# Altium footprint library LUCHADOR PCBLIB.PcbLib: 75 footprints (part 2 of 5)
Each footprint in its own frame and in the unit in brackets; x right, y up, seen from the top. Pads: shape width x height; smd on the part's side, far side on the other; paste and mask are expansions set on the pad; w line width, h text height; cw(c..) or ccw(c..) is an arc to the next point about the centre after c.
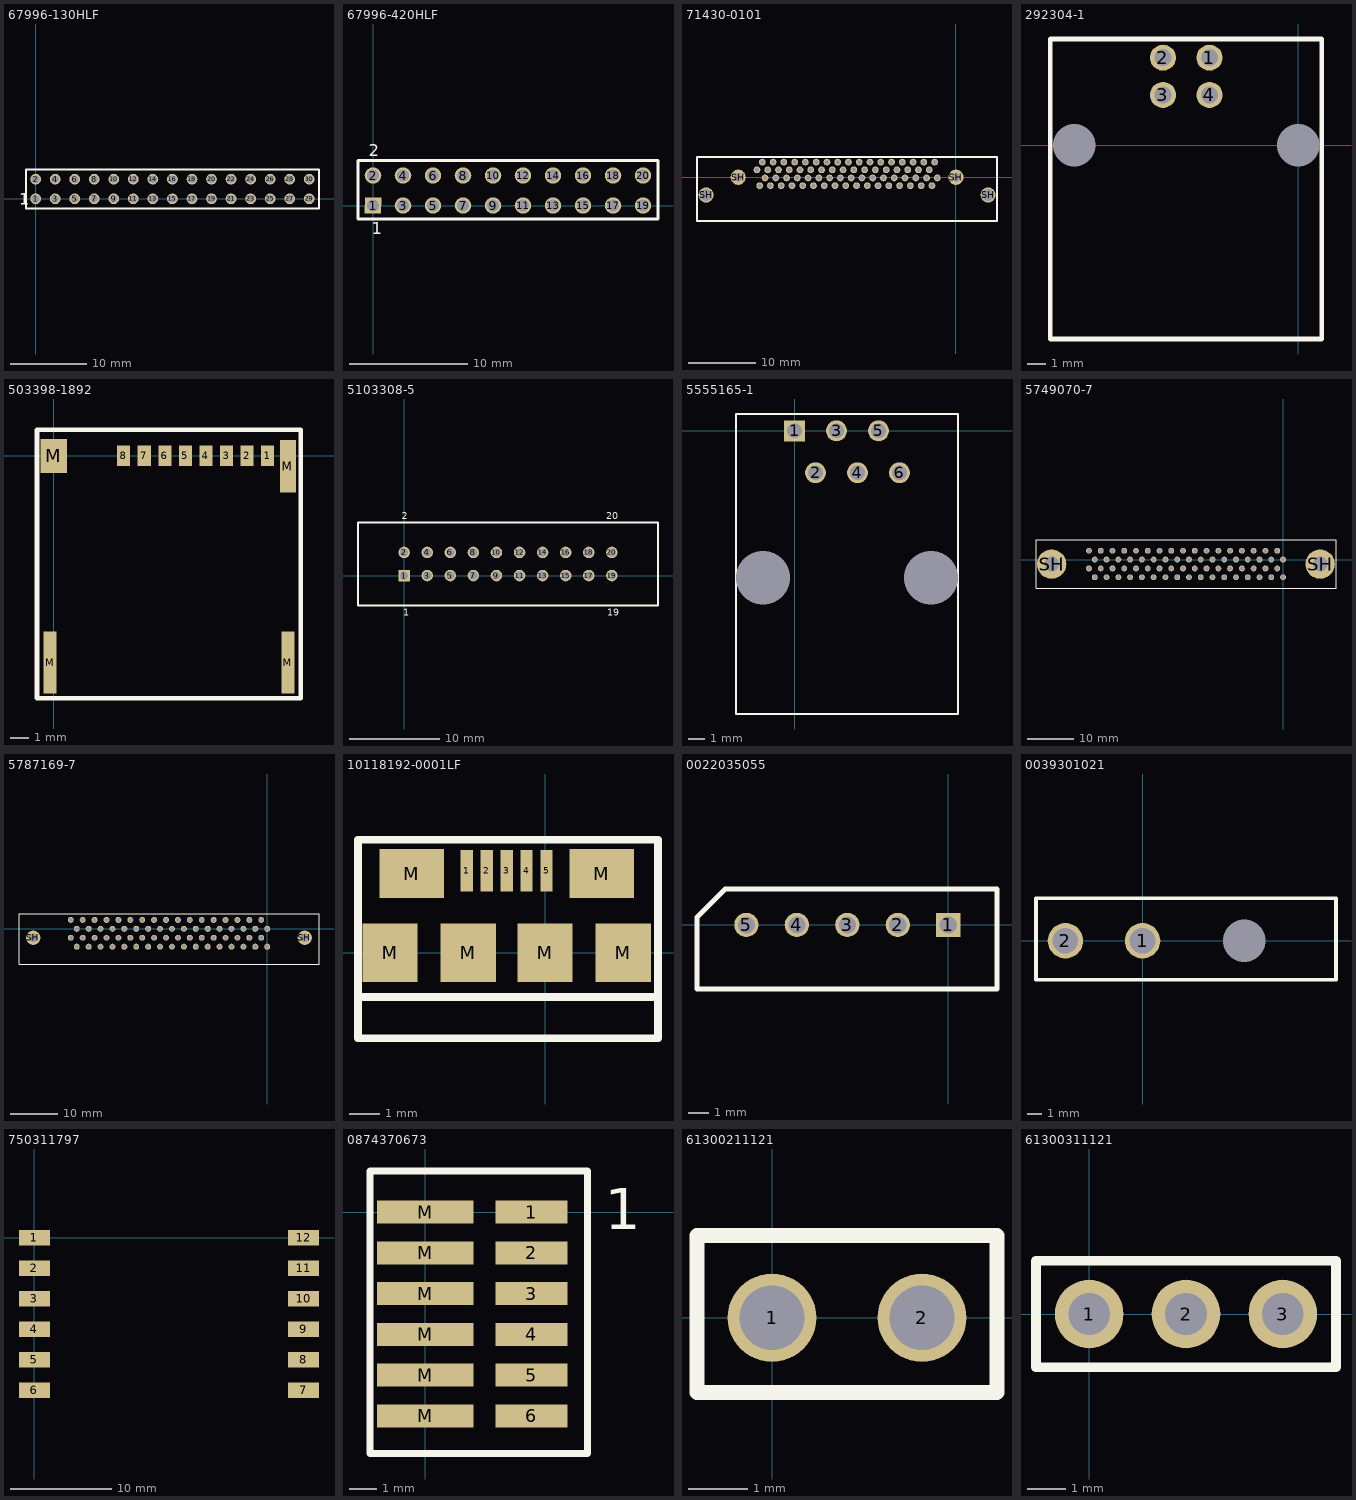
[diagram p1: the footprints below, top view; thin cyan lines are the x and y axes]

## 67996-130HLF [mil]
pads (30):
  round 55 hole 40: 1(0,0) 2(0,100) 3(100,0) 4(100,100) 5(200,0) 6(200,100) 7(300,0) 8(300,100) 9(400,0) 10(400,100) 11(500,0) 12(500,100) 13(600,0) 14(600,100) 15(700,0) 16(700,100) 17(800,0) 18(800,100) 19(900,0) 20(900,100) 21(1000,0) 22(1000,100) 23(1100,0) 24(1100,100) 25(1200,0) 26(1200,100) 27(1300,0) 28(1300,100) 29(1400,0) 30(1400,100)
Top Overlay:
  lines w10: -50,-50 1450,-50 1450,150 -50,150 -50,-50
  text "1" at -85,-30 h60
3D body "67996-130HLF.stp": height 350.5, standoff -199.5, extent -50,-49.99 1450,150.01

## 67996-420HLF [mil]
pads (20):
  rect 55x55 hole 40: 1(0,0)
  round 55 hole 40: 2(0,100) 3(100,0) 4(100,100) 5(200,0) 6(200,100) 7(300,0) 8(300,100) 9(400,0) 10(400,100) 11(500,0) 12(500,100) 13(600,0) 14(600,100) 15(700,0) 16(700,100) 17(800,0) 18(800,100) 19(900,0) 20(900,100)
Top Overlay:
  lines w10: -50,-45 -50,150 950,150 950,-45 -50,-45
  text "2" at -15,165 h40
  text "1" at -5,-95 h40
3D body "67996-420HLF.STEP": height 330.68, standoff -94.52, extent -50,-44 950,146

## 71430-0101 [mm]
pads (72):
  round 1 hole 0.65: 1(-3.17,2.25) 2(-3.97,1.1) 3(-4.77,2.25) 4(-5.57,1.1) 5(-6.37,2.25) 6(-7.17,1.1) 7(-7.97,2.25) 8(-8.77,1.1) 9(-9.57,2.25) 10(-10.37,1.1) 11(-11.17,2.25) 12(-11.97,1.1) 13(-12.77,2.25) 14(-13.57,1.1) 15(-14.37,2.25) 16(-15.17,1.1) 17(-15.97,2.25) 18(-16.77,1.1) 19(-17.57,2.25) 20(-18.37,1.1) 21(-19.17,2.25) 22(-19.97,1.1) 23(-20.77,2.25) 24(-21.57,1.1) 25(-22.37,2.25) 26(-23.17,1.1) 27(-23.97,2.25) 28(-24.77,1.1) 29(-25.57,2.25) 30(-26.37,1.1) 31(-27.17,2.25) 32(-27.97,1.1) 33(-28.77,2.25) 34(-29.57,1.1) 35(-2.77,-0.1) 36(-3.57,-1.25) 37(-4.37,-0.1) 38(-5.17,-1.25) 39(-5.97,-0.1) 40(-6.77,-1.25) 41(-7.57,-0.1) 42(-8.37,-1.25) 43(-9.17,-0.1) 44(-9.97,-1.25) 45(-10.77,-0.1) 46(-11.57,-1.25) 47(-12.37,-0.1) 48(-13.17,-1.25) 49(-13.97,-0.1) 50(-14.77,-1.25) 51(-15.57,-0.1) 52(-16.37,-1.25) 53(-17.17,-0.1) 54(-17.97,-1.25) 55(-18.77,-0.1) 56(-19.57,-1.25) 57(-20.37,-0.1) 58(-21.17,-1.25) 59(-21.97,-0.1) 60(-22.77,-1.25) 61(-23.57,-0.1) 62(-24.37,-1.25) 63(-25.17,-0.1) 64(-25.97,-1.25) 65(-26.77,-0.1) 66(-27.57,-1.25) 67(-28.37,-0.1) 68(-29.17,-1.25)
  round 2.25 hole 1.75: SH(-37.12,-2.63) SH(4.78,-2.63)
  round 2.25 hole 1.2: SH(-32.35,0) SH(0,0)
Top Overlay:
  lines w0.254: -38.476,-6.502 -38.476,3.012 6.101,3.012 6.101,-6.502 -38.476,-6.502
3D body "714300101.stp": height 6.29, standoff -2.47, extent -37.519,-11.953 5.181,2.697

## 292304-1 [mm]
pads (6):
  round 1.4 hole 0.92: 1(-4.77,4.71) 2(-7.27,4.71) 3(-7.27,2.71) 4(-4.77,2.71)
  round 0 hole 2.3 unplated: M(-12.04,0) M(0,0)
Top Overlay:
  lines w0.254: -13.335,-10.414 -13.335,5.715 1.27,5.715 1.27,-10.414 -13.335,-10.414
3D body "c-292304-1-a-3d.stp": height 11.5, standoff -3.91, extent -13.234,-10.355 1.154,5.345

## 503398-1892 [mm]
pads (12):
  rect 0.7x1.1 smd: 1(11.44,0) 2(10.34,0) 3(9.24,0) 4(8.14,0) 5(7.04,0) 6(5.94,0) 7(4.84,0) 8(3.74,0)
  rect 0.7x3.33 smd: M(-0.193,-11.049) M(12.52,-11.049)
  rect 1.42x1.83 smd: M(0,0)
  rect 0.86x2.8 smd: M(12.52,-0.559)
Top Overlay:
  lines w0.254: -0.889,-12.954 -0.889,1.397 13.208,1.397 13.208,-12.954 -0.762,-12.954 -0.889,-12.954
3D body "5033981892.stp": height 1.29, standoff 0.01, extent -0.39,-12.638 12.71,1.412

## 5103308-5 [mil]
height 39.37
pads (20):
  rect 50x50 hole 35: 1(0,0)
  round 50 hole 35: 2(0,100) 3(100,0) 4(100,100) 5(200,0) 6(200,100) 7(300,0) 8(300,100) 9(400,0) 10(400,100) 11(500,0) 12(500,100) 13(600,0) 14(600,100) 15(700,0) 16(700,100) 17(800,0) 18(800,100) 19(900,0) 20(900,100)
Top Overlay:
  lines w10: -200,-130 -200,230 1100,230 1100,-130 -200,-130
  text "20" at 875,245 h30
  text "19" at 880,-175 h30
  text "2" at -10,245 h30
  text "1" at -5,-175 h30
3D body "c-5103308-5-b-3d.stp": height 388.48, standoff -119.52, extent -200,-130 1100,230

## 5555165-1 [mil]
height 33.46
pads (8):
  rect 50x50 hole 35: 1(0,0)
  round 50 hole 35: 2(50,-100) 3(100,0) 4(150,-100) 5(200,0) 6(250,-100)
  rect 0x0 hole 128 unplated: M(-75,-350) M(325,-350)
Top Overlay:
  lines w5: -140,-675 -140,40 390,40 390,-675 -140,-675
3D body "c-5555165-1-e-3d.stp": height 495.48, standoff -149.52, extent -136,-673 387,37

## 5749070-7 [mil]
pads (70):
  round 50 hole 35: 1(0,0) 2(-50,75) 3(-100,0) 4(-150,75) 5(-200,0) 6(-250,75) 7(-300,0) 8(-350,75) 9(-400,0) 10(-450,75) 11(-500,0) 12(-550,75) 13(-600,0) 14(-650,75) 15(-700,0) 16(-750,75) 17(-800,0) 18(-850,75) 19(-900,0) 20(-950,75) 21(-1000,0) 22(-1050,75) 23(-1100,0) 24(-1150,75) 25(-1200,0) 26(-1250,75) 27(-1300,0) 28(-1350,75) 29(-1400,0) 30(-1450,75) 31(-1500,0) 32(-1550,75) 33(-1600,0) 34(-1650,75) 35(0,-150) 36(-50,-75) 37(-100,-150) 38(-150,-75) 39(-200,-150) 40(-250,-75) 41(-300,-150) 42(-350,-75) 43(-400,-150) 44(-450,-75) 45(-500,-150) 46(-550,-75) 47(-600,-150) 48(-650,-75) 49(-700,-150) 50(-750,-75) 51(-800,-150) 52(-850,-75) 53(-900,-150) 54(-950,-75) 55(-1000,-150) 56(-1050,-75) 57(-1100,-150) 58(-1150,-75) 59(-1200,-150) 60(-1250,-75) 61(-1300,-150) 62(-1350,-75) 63(-1400,-150) 64(-1450,-75) 65(-1500,-150) 66(-1550,-75) 67(-1600,-150) 68(-1650,-75)
  round 250 hole 125: SH(-1967,-38) SH(315,-38)
Top Overlay:
  lines w10: -2100,-245 -2100,170 450,170 450,-245 -2100,-245
3D body "c-5749070-07-o-3d.stp": height 347.5, standoff -124.5, extent -2083,-240 432,166

## 5787169-7 [mil]
pads (70):
  round 50 hole 34: 1(0,0) 2(-50,75) 3(-100,0) 4(-150,75) 5(-200,0) 6(-250,75) 7(-300,0) 8(-350,75) 9(-400,0) 10(-450,75) 11(-500,0) 12(-550,75) 13(-600,0) 14(-650,75) 15(-700,0) 16(-750,75) 17(-800,0) 18(-850,75) 19(-900,0) 20(-950,75) 21(-1000,0) 22(-1050,75) 23(-1100,0) 24(-1150,75) 25(-1200,0) 26(-1250,75) 27(-1300,0) 28(-1350,75) 29(-1400,0) 30(-1450,75) 31(-1500,0) 32(-1550,75) 33(-1600,0) 34(-1650,75) 35(0,-150) 36(-50,-75) 37(-100,-150) 38(-150,-75) 39(-200,-150) 40(-250,-75) 41(-300,-150) 42(-350,-75) 43(-400,-150) 44(-450,-75) 45(-500,-150) 46(-550,-75) 47(-600,-150) 48(-650,-75) 49(-700,-150) 50(-750,-75) 51(-800,-150) 52(-850,-75) 53(-900,-150) 54(-950,-75) 55(-1000,-150) 56(-1050,-75) 57(-1100,-150) 58(-1150,-75) 59(-1200,-150) 60(-1250,-75) 61(-1300,-150) 62(-1350,-75) 63(-1400,-150) 64(-1450,-75) 65(-1500,-150) 66(-1550,-75) 67(-1600,-150) 68(-1650,-75)
  round 120 hole 75: SH(-1965,-75) SH(315,-75)
Top Overlay:
  lines w10: -2085,-296 435,-296 435,125 -2085,125 -2085,-296
3D body "c-5787169-7-b-3d.stp": height 374.5, standoff -99.5, extent -2082,-534 433,126

## 10118192-0001LF [mm]
pads (11):
  rect 0.4x1.35 smd: 1(-2.55,2.675) 2(-1.9,2.675) 3(-1.25,2.675) 4(-0.6,2.675) 5(0.05,2.675)
  rect 1.8x1.9 smd: M(-5.05,0) M(-2.5,0) M(0,0) M(2.55,0)
  rect 2.1x1.6 smd: M(-4.35,2.575) M(1.85,2.575)
Top Overlay:
  lines w0.254: -6.096,-1.45 3.683,-1.45 ; -6.096,-2.794 3.683,-2.794 3.683,3.683 -6.096,3.683 -6.096,-2.794
3D body "10118192C.stp": height 2.72, standoff -0.29, extent -5.283,-2.732 2.63,2.929

## 0022035055 [mm]
pads (5):
  rect 1.2x1.2 hole 0.85: 1(0,0)
  round 1.2 hole 0.85: 2(-2.5,0) 3(-5,0) 4(-7.5,0) 5(-10,0)
Top Overlay:
  lines w0.254: -12.446,-3.175 2.413,-3.175 2.413,1.778 -11.049,1.778 -12.446,0.381 -12.446,-3.175
3D body "022035055.stp": height 5.91, standoff -3.49, extent -12.462,-3.11 2.438,1.79

## 0039301021 [mil]
pads (3):
  round 100 hole 72: 1(0,0) 2(-217,0)
  round 0 hole 120 unplated: M(287,0)
Top Overlay:
  lines w10: -300,-110 -300,120 -240,120 545,120 545,-110 -300,-110
3D body "039301021.stp": height 433.55, standoff -157, extent -242.42,-108.35 542.42,120

## 750311797 [mil]
pads (12):
  rect 120x60 smd: 1(0,0) 2(0,-118.11) 3(0,-236.22) 4(0,-354.33) 5(0,-472.44) 6(0,-590.55) 7(1044,-590.55) 8(1044,-472.44) 9(1044,-354.33) 10(1044,-236.22) 11(1044,-118.11) 12(1044,0)
3D body "750311797.STEP": height 460.5, standoff 0.5, extent -52.49,-750.99 1092.51,159

## 0874370673 [mm]
pads (12):
  rect 2.65x0.85 smd: 1(3.912,0) 2(3.912,-1.5) 3(3.912,-3) 4(3.912,-4.5) 5(3.912,-6) 6(3.912,-7.5)
  rect 3.55x0.85 smd: M(0,-7.5) M(0,-6) M(0,-4.5) M(0,-3) M(0,-1.5) M(0,0)
Top Overlay:
  lines w0.254: -2.032,-8.89 5.969,-8.89 5.969,1.524 -2.032,1.524 -2.032,-8.89
  text "1" at 6.604,-0.635 h1.52
3D body "874370673.stp": height 6.11, standoff 0.01, extent -0.461,-8.884 5.969,1.416

## 61300211121 [mm]
pads (2):
  round 1.5 hole 1.1: 1(0,0) 2(2.54,0)
Top Overlay:
  lines w0.254: -1.27,-1.27 3.81,-1.27 3.81,1.397 -1.27,1.397 -1.27,-1.27
3D body "Download_STP_61300211121 (rev1).stp": height 8.55, standoff -2.99, extent -1.27,-1.245 3.81,1.295

## 61300311121 [mm]
pads (3):
  round 1.8 hole 1.1: 1(0,0) 2(2.54,0) 3(5.08,0)
Top Overlay:
  lines w0.254: -1.397,-1.397 6.477,-1.397 6.477,1.397 -1.397,1.397 -1.397,-1.397
3D body "Download_STP_61300311121 (rev1).stp": height 8.05, standoff -3.49, extent -1.27,-1.27 6.35,1.27